# Altium footprint library 电容.PcbLib: 180 footprints (part 1 of 12)
Each footprint in its own frame and in the unit in brackets; x right, y up, seen from the top. Pads: shape width x height; smd on the part's side, far side on the other; paste and mask are expansions set on the pad; w line width, h text height; cw(c..) or ccw(c..) is an arc to the next point about the centre after c.
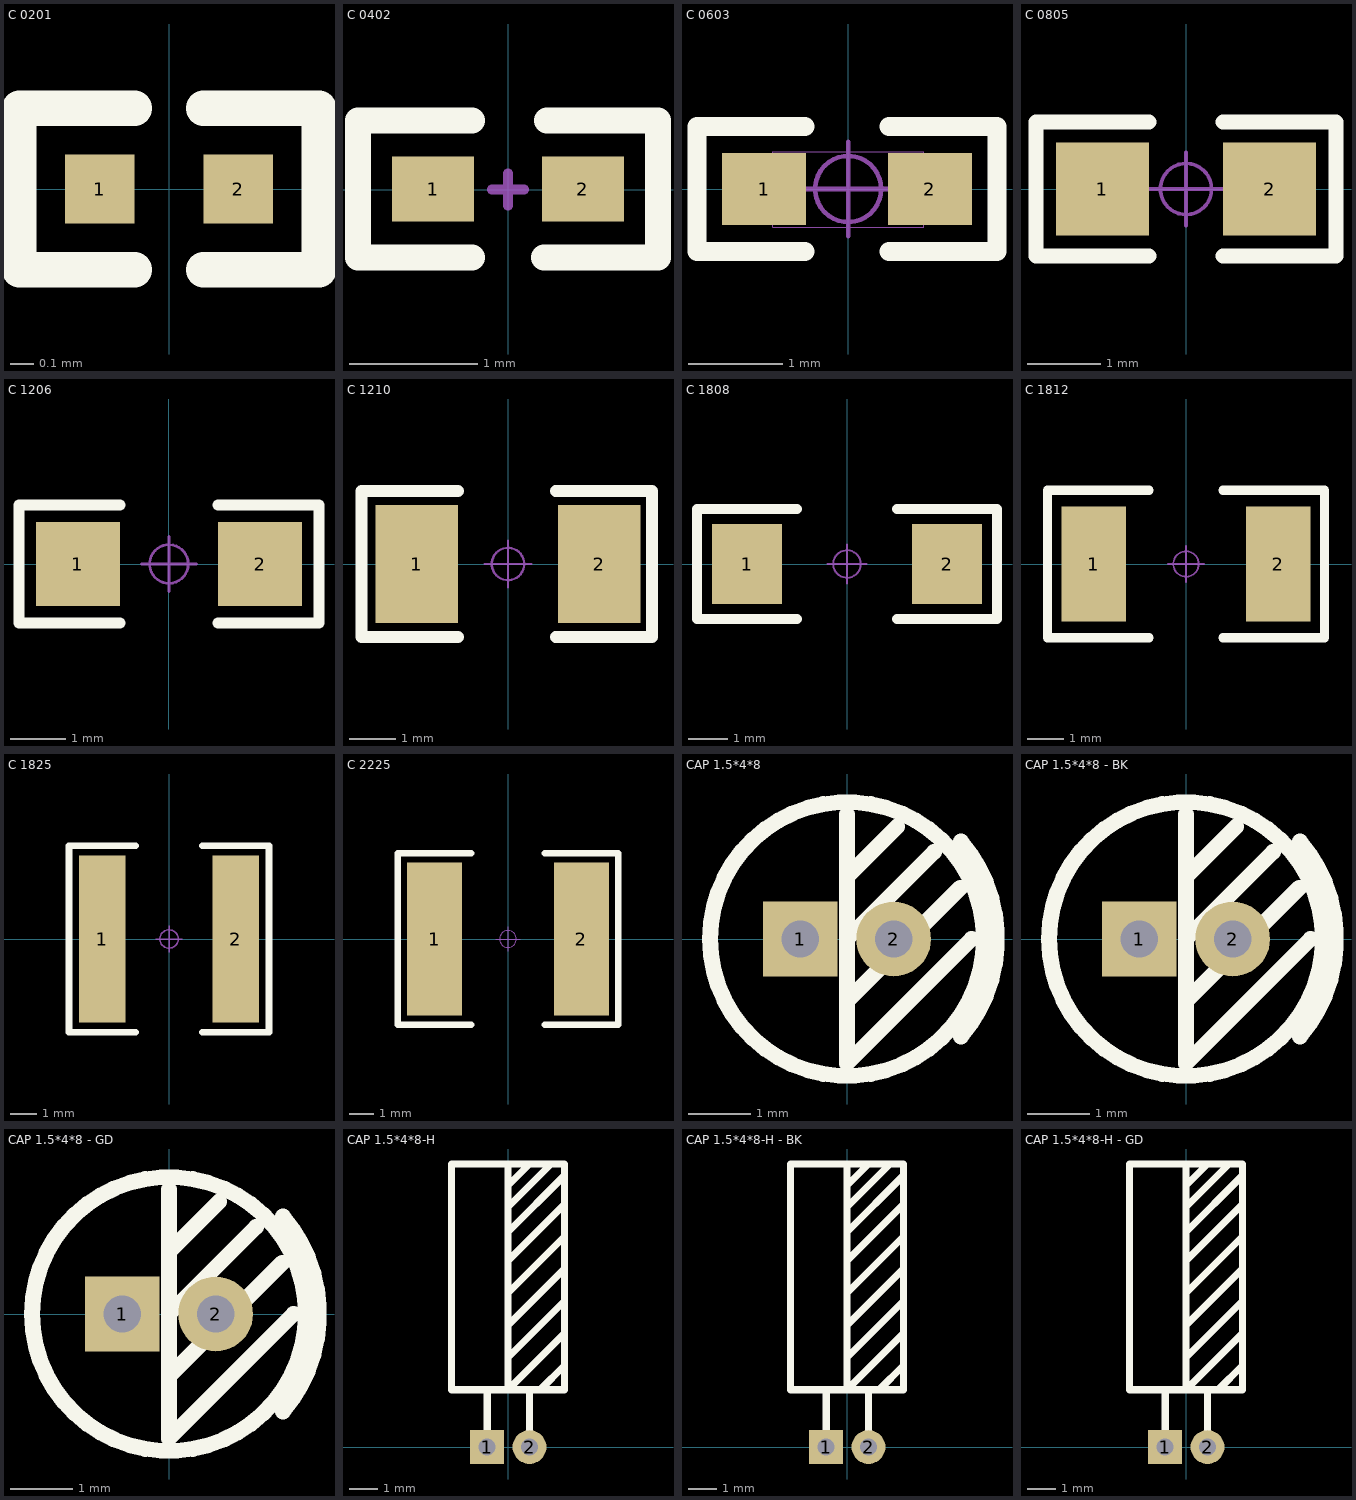
[diagram p0: the footprints below, top view; thin cyan lines are the x and y axes]

## C 0201 [mm] "无极性贴片电容"
pads (2):
  rect 0.3x0.3 smd: 1(-0.3,0) 2(0.3,0)
Top Overlay:
  lines w0.152: -0.15,-0.35 -0.65,-0.35 -0.65,0.35 -0.15,0.35 ; 0.15,-0.35 0.65,-0.35 0.65,0.35 0.15,0.35
3D body: height 0.31, standoff -0.01, extent -0.3,-0.16 0.3,0.16

## C 0402 [mil] "无极性贴片电容"
pads (2):
  rect 25x20 smd: 1(-23,0.16) 2(23,0.16)
Top Overlay:
  lines w8: -11,-20.84 -46,-20.84 -46,21.16 -11,21.16 ; 11,-20.84 46,-20.84 46,21.16 12,21.16
Mechanical 15:
  lines w3: -5,0 5,0 ; 0,-5 0,5
3D body: height 20.08, standoff -0.39, extent -19.69,-10.24 19.69,10.24

## C 0603 [mil] "无极性贴片电容"
pads (2):
  rect 35x30 smd: 1(-35,0) 2(34,0)
Top Overlay:
  lines w8: -18,-26 -63,-26 -63,26 -18,26 ; 17,-26 62,-26 62,26 17,26
Mechanical 13:
  lines w0.39: -31.5,-16 -31.5,15.5 31.5,15.5 31.5,-16 -31.5,-16
Mechanical 15:
  circle w1.97: c0,0 r13.78
  lines w1.97: -19.68,0 19.68,0 ; 0,-19.68 0,19.68
3D body: height 31.89, standoff -0.39, extent -31.5,-16.14 31.5,16.14

## C 0805 [mil] "无极性贴片电容"
height 19.68
pads (2):
  rect 50x50 smd: 1(-45,0) 2(45,0)
Top Overlay:
  lines w8: -20,-36 -80.71,-36 -80.71,36 -20,36 ; 20,-36 80.71,-36 80.71,36 20,36
Mechanical 15:
  circle w1.97: c0,0 r13.78
  lines w1.97: -19.68,0 19.68,0 ; 0,-19.68 0,19.68
3D body: height 20.08, standoff -0.39, extent -39.37,-24.02 39.37,24.02

## C 1206 [mil] "无极性贴片电容"
pads (2):
  rect 60x60 smd: 1(-65,0) 2(65,0)
Top Overlay:
  lines w8: -35,-42 -107,-42 -107,42 -35,42 ; 35,-42 107,-42 107,42 35,42
Mechanical 15:
  circle w1.97: c0,0 r13.78
  lines w1.97: -19.68,0 19.68,0 ; 0,-19.68 0,19.68
3D body: height 47.64, standoff -0.39, extent -62.99,-31.89 62.99,31.89

## C 1210 [mil] "无极性贴片电容"
pads (2):
  rect 70x100 smd: 1(-77.5,0) 2(77.5,0)
Top Overlay:
  lines w10: -42.5,-62 -124.5,-62 -124.5,62 -42.5,62 ; 40.5,-62 122.5,-62 122.5,62 40.5,62
Mechanical 15:
  circle w1.97: c0,0 r13.78
  lines w1.97: -19.68,0 19.68,0 ; 0,-19.68 0,19.68
3D body "C 1210.STEP": height 60.43, standoff 0.2, extent -62.99,-50.59 62.99,50.59

## C 1808 [mil] "无极性贴片电容"
pads (2):
  rect 70x80 smd: 1(-100,0) 2(100,0)
Top Overlay:
  lines w10: -50,-55 -150,-55 -150,55 -50,55 ; 50,-55 150,-55 150,55 50,55
Mechanical 15:
  circle w1.97: c0,0 r13.78
  lines w1.97: -19.68,0 19.68,0 ; 0,-19.68 0,19.68
3D body "C 1808.STEP": height 59.45, standoff -0.39, extent -90.55,-39.76 90.55,39.76

## C 1812 [mil] "无极性贴片电容"
pads (2):
  rect 70x125 smd: 1(-100,0) 2(100,0)
Top Overlay:
  lines w10: -40,-80 -150,-80 -150,80 -70,80 -50,80 -40,80 ; 40,-80 50,-80 150,-80 150,80 50,80 40,80
Mechanical 15:
  circle w1.97: c0,0 r13.78
  lines w1.97: -19.68,0 19.68,0 ; 0,-19.68 0,19.68
3D body: height 79.13, standoff -0.39, extent -90.55,-63.39 90.55,63.39

## C 1825 [mil] "无极性贴片电容"
pads (2):
  rect 70x250 smd: 1(-100,0) 2(100,0)
Top Overlay:
  lines w10: -50,-140 -150,-140 -150,140 -50,140 ; 50,-140 150,-140 150,140 50,140
Mechanical 15:
  circle w1.97: c0,0 r13.78
  lines w1.97: -19.68,0 19.68,0 ; 0,-19.68 0,19.68
3D body "C 1825.STEP": height 63.39, standoff -0.39, extent -88.58,-125.4 88.58,125.4

## C 2225 [mil] "无极性贴片电容"
pads (2):
  rect 90x250 smd: 1(-120,0) 2(120,0)
Top Overlay:
  lines w10: -60,-140 -70,-140 -180,-140 -180,140 -60,140 ; 60,-140 180,-140 180,140 60,140
Mechanical 15:
  circle w1.97: c0,0 r13.78
  lines w1.97: -19.68,0 19.68,0 ; 0,-19.68 0,19.68
3D body "C 2225.STEP": height 63.39, standoff -0.39, extent -110.24,-125.4 110.24,125.4

## CAP 1.5*4*8 [mm] "脚距1.5mm直径4mm高度8mm"
pads (2):
  rect 1.2x1.2 hole 0.6: 1(-0.75,0)
  round 1.2 hole 0.6: 2(0.75,0)
Top Overlay:
  circle w0.254: c0,0 r2.2
  lines w0.254: 0,-1 1.821,0.821 ; 0,0 1.397,1.397 ; 0,1 0.808,1.808 ; 0,2 0,-2 2,0 ; 1.83,-1.568 ccw(c0,0) 1.83,1.568
3D body: height 8.04, standoff -3.46, extent -2,-1.999 2.02,1.999

## CAP 1.5*4*8 - BK [mm] "脚距1.5mm直径4mm高度8mm"
pads (2):
  rect 1.2x1.2 hole 0.6: 1(-0.75,0)
  round 1.2 hole 0.6: 2(0.75,0)
Top Overlay:
  circle w0.254: c0,0 r2.2
  lines w0.254: 0,-1 1.821,0.821 ; 0,0 1.397,1.397 ; 0,1 0.808,1.808 ; 0,2 0,-2 2,0 ; 1.83,-1.568 ccw(c0,0) 1.83,1.568
3D body "CAP 1.5X4X8.STEP": height 8.05, standoff -3.45, extent -2,-1.999 2.02,1.999

## CAP 1.5*4*8 - GD [mm] "脚距1.5mm直径4mm高度8mm"
pads (2):
  rect 1.2x1.2 hole 0.6: 1(-0.75,0)
  round 1.2 hole 0.6: 2(0.75,0)
Top Overlay:
  circle w0.254: c0,0 r2.2
  lines w0.254: 0,-1 1.821,0.821 ; 0,0 1.397,1.397 ; 0,1 0.808,1.808 ; 0,2 0,-2 2,0 ; 1.83,-1.568 ccw(c0,0) 1.83,1.568
3D body "CAP 1.5X4X8.STEP": height 8.06, standoff -3.44, extent -2,-1.999 2.02,1.999

## CAP 1.5*4*8-H [mm] "脚距1.5mm直径4mm高度8mm"
pads (2):
  rect 1.2x1.2 hole 0.6: 1(-0.75,0)
  round 1.2 hole 0.6: 2(0.75,0)
Top Overlay:
  lines w0.254: -0.75,0 -0.75,2 ; -0.012,3.175 1.988,5.175 1.988,5.207 ; -0.012,4.318 1.988,6.318 1.988,6.35 ; -0.012,5.461 1.988,7.461 1.988,7.493 ; -0.012,6.604 1.988,8.604 1.988,8.636 ; -0.012,7.62 1.965,9.597 ccw(c1.911,9.652) 1.988,9.652 ; -0.012,8.509 1.51,10.031 cw(c1.512,10.03) 1.512,10.032 ; -0.012,9.271 0.748,10.031 cw(c0.75,10.03) 0.75,10.032 ; -0.012,10.032 -0.012,2.032 ; 0.75,0 0.75,2 ; 0.877,2.921 -0.012,2.032 ; 1.131,2.032 1.988,2.889 1.988,2.921 ; 1.988,4.064 1.988,4.032 -0.012,2.032 ; -2.012,2.032 -2.012,10.032 1.988,10.032 1.988,2.032 -2.012,2.032
3D body "CAP 1.5X4X8-H.STEP": height 4.02, standoff -3.48, extent -2,-0.25 2.02,10

## CAP 1.5*4*8-H - BK [mm] "脚距1.5mm直径4mm高度8mm"
pads (2):
  rect 1.2x1.2 hole 0.6: 1(-0.75,0)
  round 1.2 hole 0.6: 2(0.75,0)
Top Overlay:
  lines w0.254: -0.75,0 -0.75,2 ; -0.012,3.175 1.988,5.175 1.988,5.207 ; -0.012,4.318 1.988,6.318 1.988,6.35 ; -0.012,5.461 1.988,7.461 1.988,7.493 ; -0.012,6.604 1.988,8.604 1.988,8.636 ; -0.012,7.62 1.965,9.597 ccw(c1.911,9.652) 1.988,9.652 ; -0.012,8.509 1.51,10.031 cw(c1.512,10.03) 1.512,10.032 ; -0.012,9.271 0.748,10.031 cw(c0.75,10.03) 0.75,10.032 ; -0.012,10.032 -0.012,2.032 ; 0.75,0 0.75,2 ; 0.877,2.921 -0.012,2.032 ; 1.131,2.032 1.988,2.889 1.988,2.921 ; 1.988,4.064 1.988,4.032 -0.012,2.032 ; -2.012,2.032 1.988,2.032 1.988,10.032 -2.012,10.032 -2.012,2.032
3D body: height 4.02, standoff -3.48, extent -2,-0.25 2.02,10

## CAP 1.5*4*8-H - GD [mm] "脚距1.5mm直径4mm高度8mm"
pads (2):
  rect 1.2x1.2 hole 0.6: 1(-0.75,0)
  round 1.2 hole 0.6: 2(0.75,0)
Top Overlay:
  lines w0.254: -0.75,0 -0.75,2 ; -0.012,3.175 1.988,5.175 1.988,5.207 ; -0.012,4.318 1.988,6.318 1.988,6.35 ; -0.012,5.461 1.988,7.461 1.988,7.493 ; -0.012,6.604 1.988,8.604 1.988,8.636 ; -0.012,7.62 1.965,9.597 ccw(c1.911,9.652) 1.988,9.652 ; -0.012,8.509 1.51,10.031 cw(c1.512,10.03) 1.512,10.032 ; -0.012,9.271 0.748,10.031 cw(c0.75,10.03) 0.75,10.032 ; -0.012,10.032 -0.012,2.032 ; 0.75,0 0.75,2 ; 0.877,2.921 -0.012,2.032 ; 1.131,2.032 1.988,2.889 1.988,2.921 ; 1.988,4.064 1.988,4.032 -0.012,2.032 ; -2.012,2.032 -2.012,10.032 1.988,10.032 1.988,2.032 -2.012,2.032
3D body: height 4.02, standoff -3.48, extent -2,-0.25 2.02,10